# Altium footprint library 3.90-SH1.0连接器.PcbLib: 4 footprints
Each footprint in its own frame and in the unit in brackets; x right, y up, seen from the top. Pads: shape width x height; smd on the part's side, far side on the other; paste and mask are expansions set on the pad; w line width, h text height; cw(c..) or ccw(c..) is an arc to the next point about the centre after c.
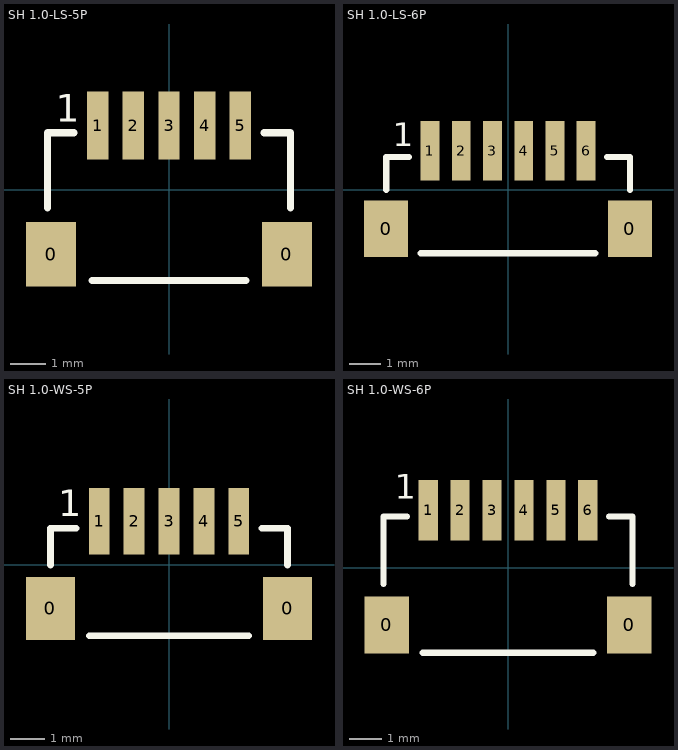
[diagram p0: the footprints below, top view; thin cyan lines are the x and y axes]

## SH 1.0-LS-5P [mm] "[ PCBѧϰȺ514746572 ]"
pads (7):
  rect 1.4x1.8 smd: 0(-3.3,-1.8) 0(3.3,-1.8)
  rect 0.6x1.9 smd: 1(-2,1.8) 2(-1,1.8) 3(0,1.8) 4(1,1.8) 5(2,1.8)
Top Overlay:
  lines w0.2: -3.4,-0.508 -3.4,1.6 -2.667,1.6 ; -2.159,-2.54 2.159,-2.54 ; 2.667,1.6 3.3,1.6 3.4,1.6 3.4,1.5 3.4,-0.508
  text "1" at -3.175,1.905 h0.76
3D body "SH1.0-05b.STEP": height 2.9, standoff 0, extent -3.5,-2.54 3.5,2.41

## SH 1.0-LS-6P [mm] "[ PCBѧϰȺ514746572 ]"
pads (8):
  rect 1.4x1.8 smd: 0(-3.9,-1.25) 0(3.9,-1.25)
  rect 0.6x1.9 smd: 1(-2.5,1.25) 2(-1.5,1.25) 3(-0.5,1.25) 4(0.5,1.25) 5(1.5,1.25) 6(2.5,1.25)
Top Overlay:
  lines w0.2: -3.9,0 -3.9,1.05 -3.175,1.05 ; -2.794,-2.032 2.794,-2.032 ; 3.175,1.05 3.9,1.05 3.9,0
  text "1" at -3.683,1.397 h0.76
3D body "SH1.0-06b.STEP": height 4.25, standoff 0, extent -4,-1.905 4,1.695

## SH 1.0-WS-5P [mm] "[ PCBѧϰȺ514746572 ]"
pads (7):
  rect 1.4x1.8 smd: 0(-3.4,-1.25) 0(3.4,-1.25)
  rect 0.6x1.9 smd: 1(-2,1.25) 2(-1,1.25) 3(0,1.25) 4(1,1.25) 5(2,1.25)
Top Overlay:
  lines w0.2: -3.4,0 -3.4,1.05 -2.667,1.05 ; -2.286,-2.032 2.286,-2.032 ; 2.667,1.05 3.4,1.05 3.4,0
  text "1" at -3.175,1.397 h0.76
3D body "SH1.0-05.STEP": height 4.25, standoff 0, extent -3.5,-1.905 3.5,1.695

## SH 1.0-WS-6P [mm] "[ PCBѧϰȺ514746572 ]"
pads (8):
  rect 1.4x1.8 smd: 0(-3.8,-1.8) 0(3.8,-1.8)
  rect 0.6x1.9 smd: 1(-2.5,1.8) 2(-1.5,1.8) 3(-0.5,1.8) 4(0.5,1.8) 5(1.5,1.8) 6(2.5,1.8)
Top Overlay:
  lines w0.2: -3.9,-0.508 -3.9,1.6 -3.175,1.6 ; -2.667,-2.667 2.667,-2.667 ; 3.175,1.6 3.8,1.6 3.9,1.6 3.9,1.588 3.9,-0.508
  text "1" at -3.556,2.159 h0.76
3D body "SH1.0-06.STEP": height 2.9, standoff 0, extent -4,-2.726 4,2.224